# Altium footprint library Connectors.PcbLib: 76 footprints (part 3 of 5)
Each footprint in its own frame and in the unit in brackets; x right, y up, seen from the top. Pads: shape width x height; smd on the part's side, far side on the other; paste and mask are expansions set on the pad; w line width, h text height; cw(c..) or ccw(c..) is an arc to the next point about the centre after c.
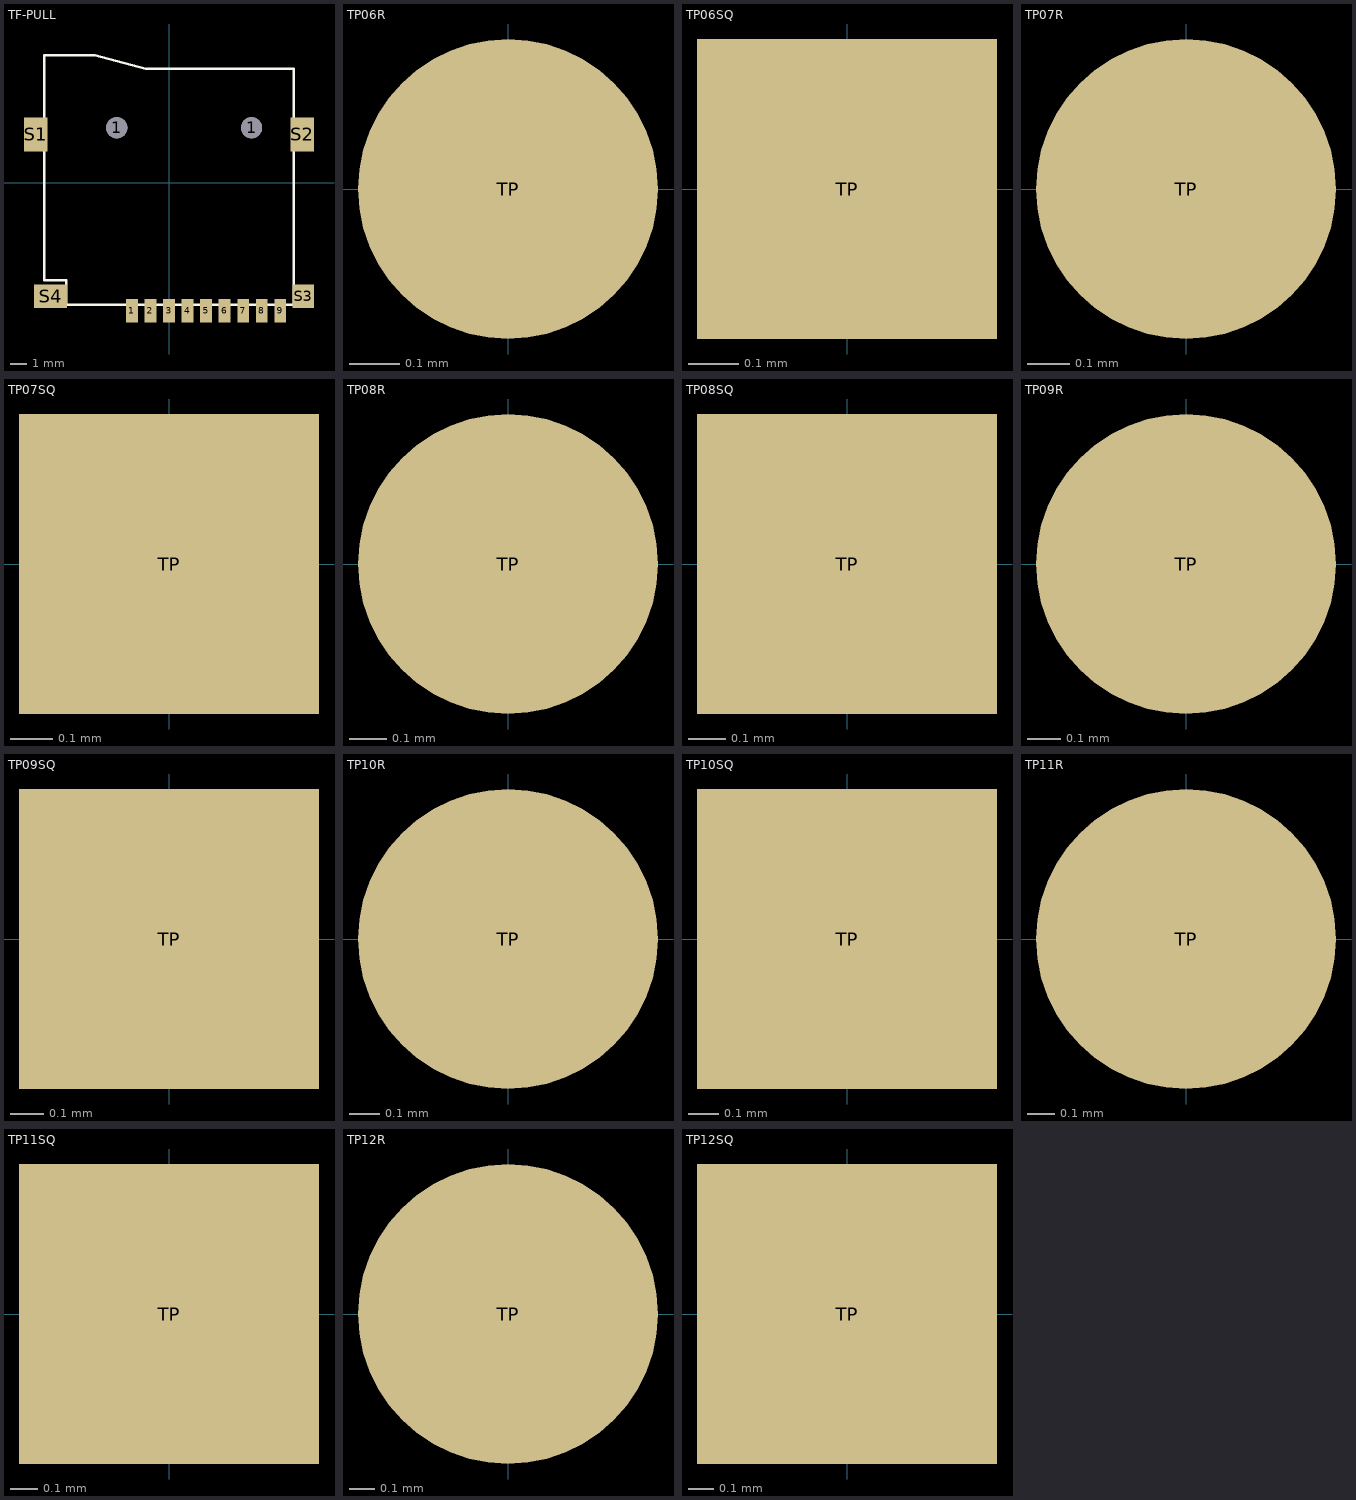
[diagram p2: the footprints below, top view; thin cyan lines are the x and y axes]

## SO-DIMM 200PIN [mm]
3D body "c-2013022-1-b-3d.stp": height 4.15, standoff -0.65, extent -35.75,-3.12 35.75,23.33

## TF-PULL [mm]
pads (15):
  round 1.25 hole 1.25: 1(-3.1,3.25) 1(4.9,3.25)
  rect 0.7x1.4 smd: 1(-2.2,-7.62) 2(-1.1,-7.62) 3(0,-7.62) 4(1.1,-7.62) 5(2.2,-7.62) 6(3.3,-7.62) 7(4.4,-7.62) 8(5.5,-7.62) 9(6.6,-7.62)
  rect 1.4x2 smd: S1(-7.9,2.85) S2(7.9,2.85)
  rect 1.28x1.4 smd: S3(7.96,-6.75)
  rect 1.95x1.4 smd: S4(-7.025,-6.75)
Top Overlay:
  lines w0.127: -7.4,-5.8 -7.4,7.55 -4.4,7.55 -1.4,6.75 7.4,6.75 7.4,-7.25 -6.1,-7.25 -6.1,-5.8 -7.4,-5.8
3D body "tf.step": height 1.85, standoff -0.6, extent -8.099,-7.493 8.001,7.51

## TP06R [mm]
pads (1):
  rrect100% 0.6x0.6 smd paste-0.3: TP(0,0)

## TP06SQ [mm]
pads (1):
  rect 0.6x0.6 smd paste-0.3: TP(0,0)

## TP07R [mm]
pads (1):
  rrect100% 0.7x0.7 smd paste-0.35: TP(0,0)

## TP07SQ [mm]
pads (1):
  rect 0.7x0.7 smd paste-0.35: TP(0,0)

## TP08R [mil]
pads (1):
  rrect100% 31.5x31.5 smd paste-15.75: TP(0,0)

## TP08SQ [mil]
pads (1):
  rect 31.5x31.5 smd paste-15.75: TP(0,0)

## TP09R [mm]
pads (1):
  rrect100% 0.9x0.9 smd paste-0.45: TP(0,0)

## TP09SQ [mm]
pads (1):
  rect 0.9x0.9 smd paste-0.45: TP(0,0)

## TP10R [mm]
pads (1):
  rrect100% 1x1 smd paste-0.5: TP(0,0)

## TP10SQ [mm]
pads (1):
  rect 1x1 smd paste-0.5: TP(0,0)

## TP11R [mm]
pads (1):
  rrect100% 1.1x1.1 smd paste-0.55: TP(0,0)

## TP11SQ [mm]
pads (1):
  rect 1.1x1.1 smd paste-0.55: TP(0,0)

## TP12R [mm]
pads (1):
  rrect100% 1.2x1.2 smd paste-0.6: TP(0,0)

## TP12SQ [mm]
pads (1):
  rect 1.2x1.2 smd paste-0.6: TP(0,0)